# Altium footprint library custom-case.PcbLib: 8 footprints
Each footprint in its own frame and in the unit in brackets; x right, y up, seen from the top. Pads: shape width x height; smd on the part's side, far side on the other; paste and mask are expansions set on the pad; w line width, h text height; cw(c..) or ccw(c..) is an arc to the next point about the centre after c.
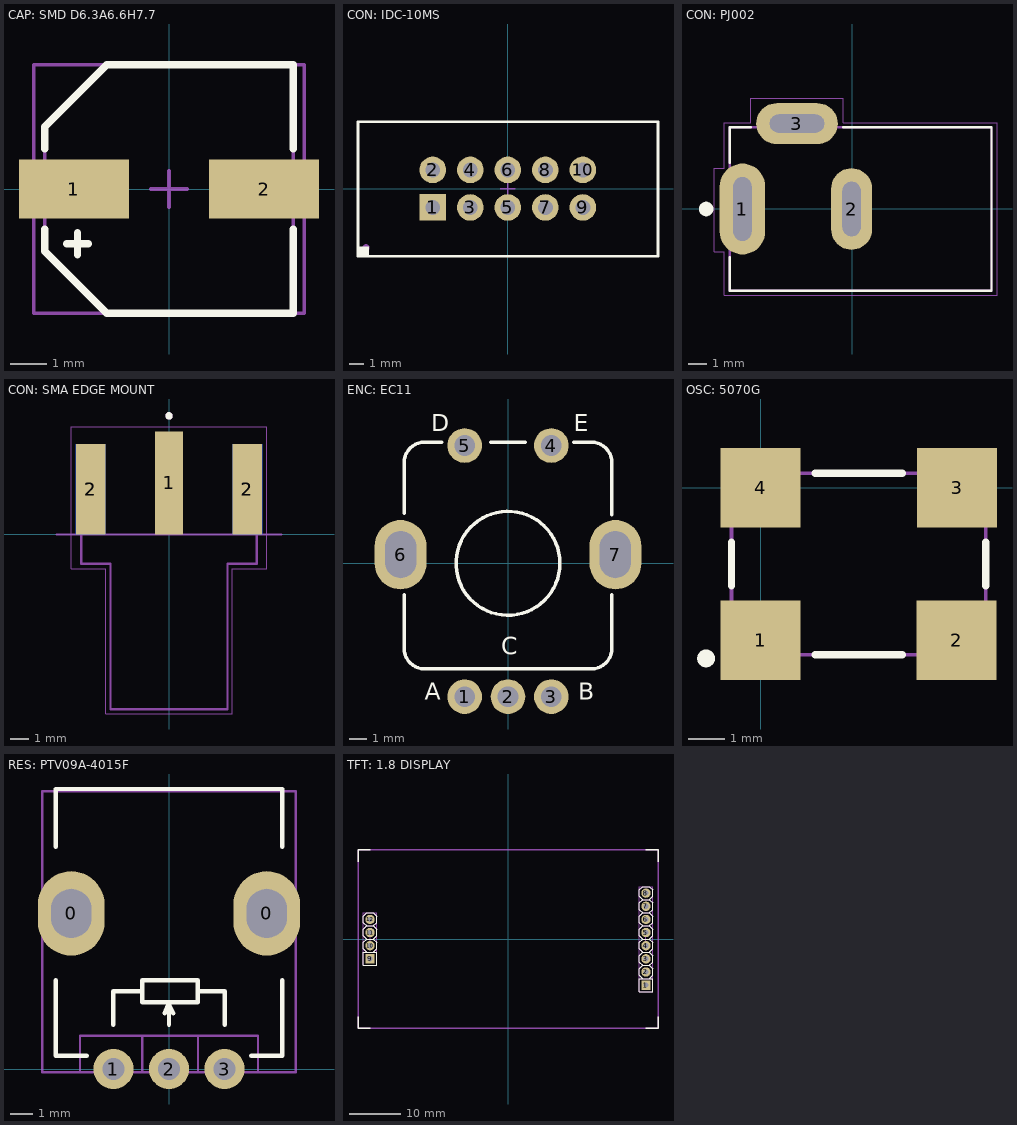
[diagram p0: the footprints below, top view; thin cyan lines are the x and y axes]

## CAP: SMD D6.3A6.6H7.7 [mm]
pads (2):
  rect 3x1.6 smd mask+0.075: 1(-2.6,0) 2(2.6,0)
Top Overlay:
  lines w0.2: -3.4,-1.1 -3.4,-1.7 -1.7,-3.4 3.4,-3.4 3.4,-1.1 ; -3.4,1.1 -3.4,1.7 -1.7,3.4 3.4,3.4 3.4,1.1 ; -2.8,-1.5 -2.2,-1.5 ; -2.5,-1.8 -2.5,-1.2
Top Assy:
  lines w0.1: -2.8,-1.5 -2.2,-1.5 ; -2.5,-1.8 -2.5,-1.7 -2.5,-1.2 ; -3.4,-1.7 -1.7,-3.4 3.4,-3.4 3.4,3.4 -1.7,3.4 -3.4,1.7 -3.4,-1.7
Size Area:
  lines w0.1: -0.5,0 0.5,0 ; 0,-0.5 0,0.5 ; -3.7,-3.4 3.7,-3.4 3.7,3.4 -3.7,3.4 -3.7,-3.4
3D body "User Library-SMD Polymer Aluminum Electrolytic Capacitors C6 39uF 16V.STEP": height 5.9, standoff -0.05, extent -3.65,-3.3 3.65,3.3

## CON: IDC-10MS [mm] "IDC-10MS 10 pin PCB-mount header"
height 10
pads (11):
  rect 1.8x1.8 hole 1: 1(-5.08,-1.27)
  round 1.8 hole 1: 2(-5.08,1.27) 3(-2.54,-1.27) 4(-2.54,1.27) 5(0,-1.27) 6(0,1.27) 7(2.54,-1.27) 8(2.54,1.27) 9(5.08,-1.27) 10(5.08,1.27)
  round 0.5 on Mech1: ""(-9.6,-4)
Top Overlay:
  rectangle: -10.14,-4.572 -9.4,-3.9
  lines w0.2: -10.14,-4.572 10.16,-4.572 10.16,4.528 -10.14,4.528 -10.14,-4.572
Top Assy:
  lines w0.1: -10.14,-4.572 -10.14,4.528 10.16,4.528 10.16,-4.572 -10.14,-4.572
Size Area:
  lines w0.1: -0.5,0 0.5,0 ; 0,-0.5 0,0.5 ; -10.14,-4.572 10.16,-4.572 10.16,4.528 -10.14,4.528 -10.14,-4.572
3D body "IDC-10MS.STEP": height 9, standoff -3.1, extent -10.14,-4.572 10.16,4.528

## CON: PJ002 [mm]
pads (3):
  oval 2.5x5 hole 1 slot 3.5 at 90 deg: 1(-6.034,-0.025)
  oval 2.25x4.5 hole 1 slot 3 at 90 deg: 2(-0.034,-0.025)
  oval 4.5x2.25 hole 1 slot 3 at 0 deg: 3(-3.034,4.675)
Top Overlay:
  circle w0.4: c-8.034,-0.025 r0.2
  lines w0.127: -6.734,-2.675 -6.734,-4.525 7.666,-4.525 7.666,4.475 -0.484,4.475 ; -6.734,2.525 -6.734,4.475 -5.584,4.475
3D model:
  lines w0.127: -6.734,-4.525 7.666,-4.525 7.666,4.475 -6.734,4.475 -6.734,-4.525
Size Area:
  lines w0.05: -7.584,-2.375 -7.584,2.225 -7.034,2.225 -7.034,4.725 -5.584,4.725 -5.584,6.075 -0.484,6.075 -0.484,4.725 7.966,4.725 7.966,-4.775 -7.034,-4.775 -7.034,-2.375 -7.584,-2.375
3D body "PJ-002B.step": height 11, standoff -4.1, extent -6.434,-4.525 7.466,4.775

## CON: SMA EDGE MOUNT [mm]
pads (5):
  rect 1.5x5.6 smd: 1(0,2.8)
  rect 1.6x4.9 smd far side: 2(-4.26,2.45) 2(4.26,2.45)
  rect 1.6x4.9 smd: 2(-4.26,2.45) 2(4.26,2.45)
Top Overlay:
  circle w0.2: c0,6.44 r0.1
3D model:
  circle w0.2: c0,6.44 r0.1
  lines w0.05: -5.31,-1.85 -5.31,5.85 5.31,5.85 5.31,-1.85 3.425,-1.85 3.425,-9.75 -3.425,-9.75 -3.425,-1.85 -5.31,-1.85
  lines w0.127: -6.09,0 -4.76,0 ; 6.09,0 4.76,0 ; -4.76,0 -4.76,-1.6 -3.175,-1.6 -3.175,-9.5 3.175,-9.5 3.175,-1.6 4.76,-1.6 4.76,0 ; -4.76,0 -3.76,0 ; -4.76,0 -4.76,4.7 -3.76,4.7 -3.76,0 ; -3.76,0 -0.39,0 ; -0.39,0 0.39,0 ; -0.39,0 -0.39,4.7 0.39,4.7 0.39,0 ; 0.39,0 3.76,0 ; 3.76,0 4.76,0 ; 3.76,0 3.76,4.7 4.76,4.7 4.76,0
  text "PCB Edge" at 5.3,-1.2 h0.81
Size Area:
  lines w0.05: -5.31,-1.85 -5.31,5.85 5.31,5.85 5.31,-1.85 3.425,-1.85 3.425,-9.75 -3.425,-9.75 -3.425,-1.85 -5.31,-1.85
3D body "step_temp.STEP": height 4.35, standoff -3.57, extent -4.76,-9.5 4.76,4.7

## ENC: EC11 [mm] "Encoder+Button"
height 4
pads (7):
  round 2 hole 1.2: 1(-2.5,-7.7) 2(0,-7.7) 3(2.5,-7.7) 4(2.5,6.8) 5(-2.5,6.8)
  oval 3x4 hole 1.8 slot 2.7 at 90 deg: 6(-6.2,0.5) 7(6.2,0.5)
Top Overlay:
  circle w0.2: c0,0 r3
  lines w0.2: -6,-1.8 -6,-4.91 ccw(c-4.81,-4.91) -4.81,-6.1 4.81,-6.1 ccw(c4.81,-4.91) 6,-4.91 6,-1.8 ; -6,2.888 -6,5.904 ; -6,5.81 cw(c-4.81,5.81) -4.81,7 -3.81,7 ; -1,7 1,7 ; 3.8,7 4.81,7 cw(c4.81,5.81) 6,5.81 ; 6,2.794 6,5.904
  text "B" at 4.064,-7.874 h1
  text "C" at -0.381,-5.258 h1
  text "D" at -4.445,7.62 h1
  text "A" at -4.81,-7.874 h1
  text "E" at 3.8,7.62 h1
3D body "SW3dPS-Encoder Alpha RE111F-41B3N-15F-20P.STEP": height 21.2, standoff -3.28, extent -6.844,-7.83 6.808,7

## OSC: 5070G [mm]
pads (5):
  rect 2.2x2.2 smd: 1(0,-4.2) 2(5.4,-4.2) 3(5.41,0) 4(0,0)
  round 0.5 on Top Overlay: ""(-1.5,-4.7)
Top Overlay:
  lines w0.2: -0.8,-2.7 -0.8,-1.5 ; 1.5,-4.6 3.9,-4.6 ; 1.5,0.4 3.9,0.4 ; 6.2,-2.7 6.2,-1.5
Top Assy:
  lines w0.1: -0.8,-4.6 -0.8,0.4 6.2,0.4 6.2,-4.6 -0.8,-4.6
3D body "User Library-50 MHz.STEP": height 1.51, standoff -0.01, extent -0.8,-4.6 6.2,0.4

## RES: PTV09A-4015F [mm]
pads (5):
  oval 3x3.8 hole 1.8 slot 2.2 at 90 deg: 0(-4.4,7) 0(4.4,7)
  round 1.8 hole 1: 1(-2.5,0) 2(0,0) 3(2.5,0)
Top Overlay:
  lines w0.2: -5.1,4 -5.1,0.6 -3.7,0.6 ; -5.1,10 -5.1,12.6 5.1,12.6 5.1,10 ; -2.5,2 -2.5,3.5 -1.2,3.5 ; -0.2,2.5 0,3 0,2 ; 0,2.9 0.2,2.5 ; 1.3,3.5 2.5,3.5 2.5,2 ; 3.7,0.6 5.1,0.6 5.1,4 ; -1.2,3.5 -1.2,3 1.3,3 1.3,4 -1.2,4 -1.2,3.5
Top Assy:
  lines w0.1: -4,-0.15 -4,1.5 4,1.5 4,-0.15 ; -2.5,2 -2.5,3.5 -1.2,3.5 ; -1.2,-0.15 -1.2,1.5 ; -0.2,2.5 0,3 ; 0,2 0,3 ; 0.2,2.5 0,3 ; 1.3,-0.15 1.3,1.5 ; 1.3,3.5 2.5,3.5 2.5,2 ; -1.2,3.5 -1.2,3 1.3,3 1.3,4 -1.2,4 -1.2,3.5 ; -5.7,-0.15 -5.7,12.5 5.7,12.5 5.7,-0.15 -5.7,-0.15
3D body "User Library-RV09ACF-40_RK09K1130A5R.STEP": height 20, standoff -3.8, extent -4.876,-0.2 4.876,12.35

## TFT: 1.8 DISPLAY [mm]
pads (12):
  rect 1.8x1.8 hole 1: 1(26.67,-8.89) 9(-26.67,-3.81)
  round 1.8 hole 1: 2(26.67,-6.35) 3(26.67,-3.81) 4(26.67,-1.27) 5(26.67,1.27) 6(26.67,3.81) 7(26.67,6.35) 8(26.67,8.89) 10(-26.67,-1.27) 11(-26.67,1.27) 12(-26.67,3.81)
Top Overlay:
  lines w0.2: -27.305,-2.54 -27.94,-1.905 -27.94,-0.635 -27.305,0 ; -26.035,-2.54 -25.4,-1.905 -25.4,-0.635 -26.035,0 ; 26.035,-7.62 25.4,-6.985 25.4,-5.715 26.035,-5.08 ; 27.305,-7.62 27.94,-6.985 27.94,-5.715 27.305,-5.08 ; -27.305,0 -26.035,0 ; -27.305,0 -27.94,0.635 -27.94,1.905 -27.305,2.54 ; -27.305,2.54 -26.035,2.54 ; -27.305,2.54 -27.94,3.175 -27.94,4.445 -27.305,5.08 -26.035,5.08 -25.4,4.445 -25.4,3.175 -26.035,2.54 ; -26.035,0 -25.4,0.635 -25.4,1.905 -26.035,2.54 ; 26.035,-5.08 25.4,-4.445 25.4,-3.175 26.035,-2.54 ; 26.035,-5.08 27.305,-5.08 ; 26.035,-2.54 25.4,-1.905 25.4,-0.635 26.035,0 ; 26.035,-2.54 27.305,-2.54 ; 26.035,0 27.305,0 ; 26.035,0 25.4,0.635 25.4,1.905 26.035,2.54 ; 26.035,2.54 27.305,2.54 ; 26.035,2.54 25.4,3.175 25.4,4.445 26.035,5.08 ; 26.035,5.08 25.4,5.715 25.4,6.985 26.035,7.62 ; 26.035,5.08 27.305,5.08 ; 26.035,7.62 25.4,8.255 25.4,9.525 26.035,10.16 27.305,10.16 27.94,9.525 27.94,8.255 27.305,7.62 ; 26.035,7.62 27.305,7.62 ; 27.305,-5.08 27.94,-4.445 27.94,-3.175 27.305,-2.54 ; 27.305,-2.54 27.94,-1.905 27.94,-0.635 27.305,0 ; 27.305,0 27.94,0.635 27.94,1.905 27.305,2.54 ; 27.305,2.54 27.94,3.175 27.94,4.445 27.305,5.08 ; 27.305,5.08 27.94,5.715 27.94,6.985 27.305,7.62 ; -27.94,-5.08 -27.94,-2.54 -25.4,-2.54 -25.4,-5.08 -27.94,-5.08 ; 25.4,-10.16 25.4,-7.62 27.94,-7.62 27.94,-10.16 25.4,-10.16
  lines w0.254: -29,-15 -29,-17.228 -26.67,-17.228 ; -29,15 -29,17.272 -26.67,17.272 ; 26.67,-17.228 29,-17.228 29,-15 ; 26.67,17.272 29,17.272 29,15
Top Assy:
  lines w0.1: -27.305,-2.54 -27.94,-1.905 -27.94,-0.635 -27.305,0 ; -26.035,-2.54 -25.4,-1.905 -25.4,-0.635 -26.035,0 ; 26.035,-7.62 25.4,-6.985 25.4,-5.715 26.035,-5.08 ; 27.305,-7.62 27.94,-6.985 27.94,-5.715 27.305,-5.08 ; -27.305,0 -27.94,0.635 -27.94,1.905 -27.305,2.54 ; -27.305,0 -26.035,0 ; -27.305,2.54 -27.94,3.175 -27.94,4.445 -27.305,5.08 -26.035,5.08 -25.4,4.445 -25.4,3.175 -26.035,2.54 ; -27.305,2.54 -26.035,2.54 ; -26.035,0 -25.4,0.635 -25.4,1.905 -26.035,2.54 ; 26.035,-5.08 25.4,-4.445 25.4,-3.175 26.035,-2.54 ; 26.035,-5.08 27.305,-5.08 ; 26.035,-2.54 27.305,-2.54 ; 26.035,-2.54 25.4,-1.905 25.4,-0.635 26.035,0 ; 26.035,0 27.305,0 ; 26.035,0 25.4,0.635 25.4,1.905 26.035,2.54 ; 26.035,2.54 25.4,3.175 25.4,4.445 26.035,5.08 ; 26.035,2.54 27.305,2.54 ; 26.035,5.08 25.4,5.715 25.4,6.985 26.035,7.62 ; 26.035,5.08 27.305,5.08 ; 26.035,7.62 27.305,7.62 ; 26.035,7.62 25.4,8.255 25.4,9.525 26.035,10.16 27.305,10.16 27.94,9.525 27.94,8.255 27.305,7.62 ; 27.305,-5.08 27.94,-4.445 27.94,-3.175 27.305,-2.54 ; 27.305,-2.54 27.94,-1.905 27.94,-0.635 27.305,0 ; 27.305,0 27.94,0.635 27.94,1.905 27.305,2.54 ; 27.305,2.54 27.94,3.175 27.94,4.445 27.305,5.08 ; 27.305,5.08 27.94,5.715 27.94,6.985 27.305,7.62 ; -27.94,-5.08 -25.4,-5.08 -25.4,-2.54 -27.94,-2.54 -27.94,-5.08 ; 25.4,-10.16 25.4,-7.62 27.94,-7.62 27.94,-10.16 25.4,-10.16
Size Area:
  lines w0.05: -27.94,-5.08 -25.4,-5.08 -25.4,5.08 -27.94,5.08 -27.94,-5.08 ; 25.4,-10.16 27.94,-10.16 27.94,10.16 25.4,10.16 25.4,-10.16
  lines w0.1: -27.17,0 -26.17,0 ; -26.67,-0.5 -26.67,0.5 ; 26.17,0 27.17,0 ; 26.67,-0.5 26.67,0.5
  lines w0.254: -29,-17.228 29,-17.228 29,17.272 -29,17.272 -29,-17.228
3D body "8x_Male_Pin_2.54_mm.STEP": height 9.54, standoff -1.56, extent 25.47,-10.16 27.87,10.16
3D body "1.8 TFT 128x160 SPI.STEP": height 11.4, standoff 3.8, extent -29,-17.25 29,17.25
3D body "4x_Male_Pin_2.54_mm.STEP": height 9.54, standoff -1.56, extent -27.87,-5.08 -25.47,5.08
3D body "8-Pin Header - Female - 2.54mm(1).step": height 5, standoff -3, extent 25.42,-10.41 27.92,10.41
3D body "4-Pin Header - Female - 2.54mm.step": height 5, standoff -3, extent -27.92,-5.33 -25.42,5.33